# Altium footprint library Reflow3D1411sep.PcbLib: 657 footprints (part 42 of 42)
Each footprint in its own frame and in the unit in brackets; x right, y up, seen from the top. Pads: shape width x height; smd on the part's side, far side on the other; paste and mask are expansions set on the pad; w line width, h text height; cw(c..) or ccw(c..) is an arc to the next point about the centre after c.
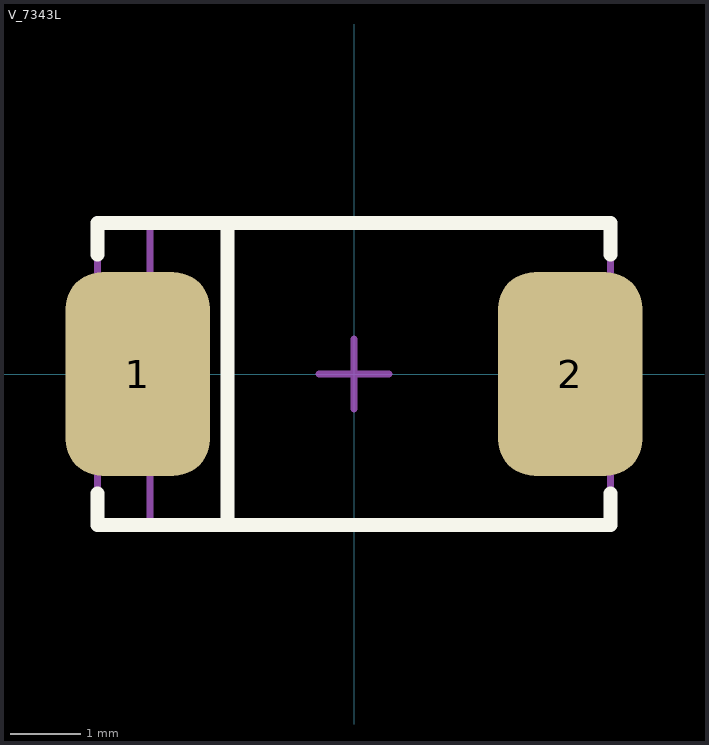
[diagram p41: the footprint, top view; thin cyan lines are the x and y axes]

## V_7343L [mm] "www.nec-tokin.com, capacitors.pdf"
height 1.9
pads (2):
  rrect50% 2.05x2.9 smd mask+0.075: 1(-3.075,0) 2(3.075,0)
Top Overlay:
  lines w0.2: -3.65,-1.7 -3.65,-2.15 3.65,-2.15 3.65,-1.7 ; -3.65,1.7 -3.65,2.15 3.65,2.15 3.65,1.7 ; -1.8,-2.15 -1.8,2.15
Mechanical 13:
  lines w0.1: -2.9,-2.15 -2.9,2.15 ; -3.65,-2.15 3.65,-2.15 3.65,2.15 -3.65,2.15 -3.65,-2.15
Mechanical 15:
  lines w0.1: -0.5,0 0.5,0 ; 0,-0.5 0,0.5
3D body: height 2, standoff 0, extent -3.75,-2.25 3.75,2.25